# Altium footprint library Eis_Lib.PcbLib: 75 footprints (part 3 of 5)
Each footprint in its own frame and in the unit in brackets; x right, y up, seen from the top. Pads: shape width x height; smd on the part's side, far side on the other; paste and mask are expansions set on the pad; w line width, h text height; cw(c..) or ccw(c..) is an arc to the next point about the centre after c.
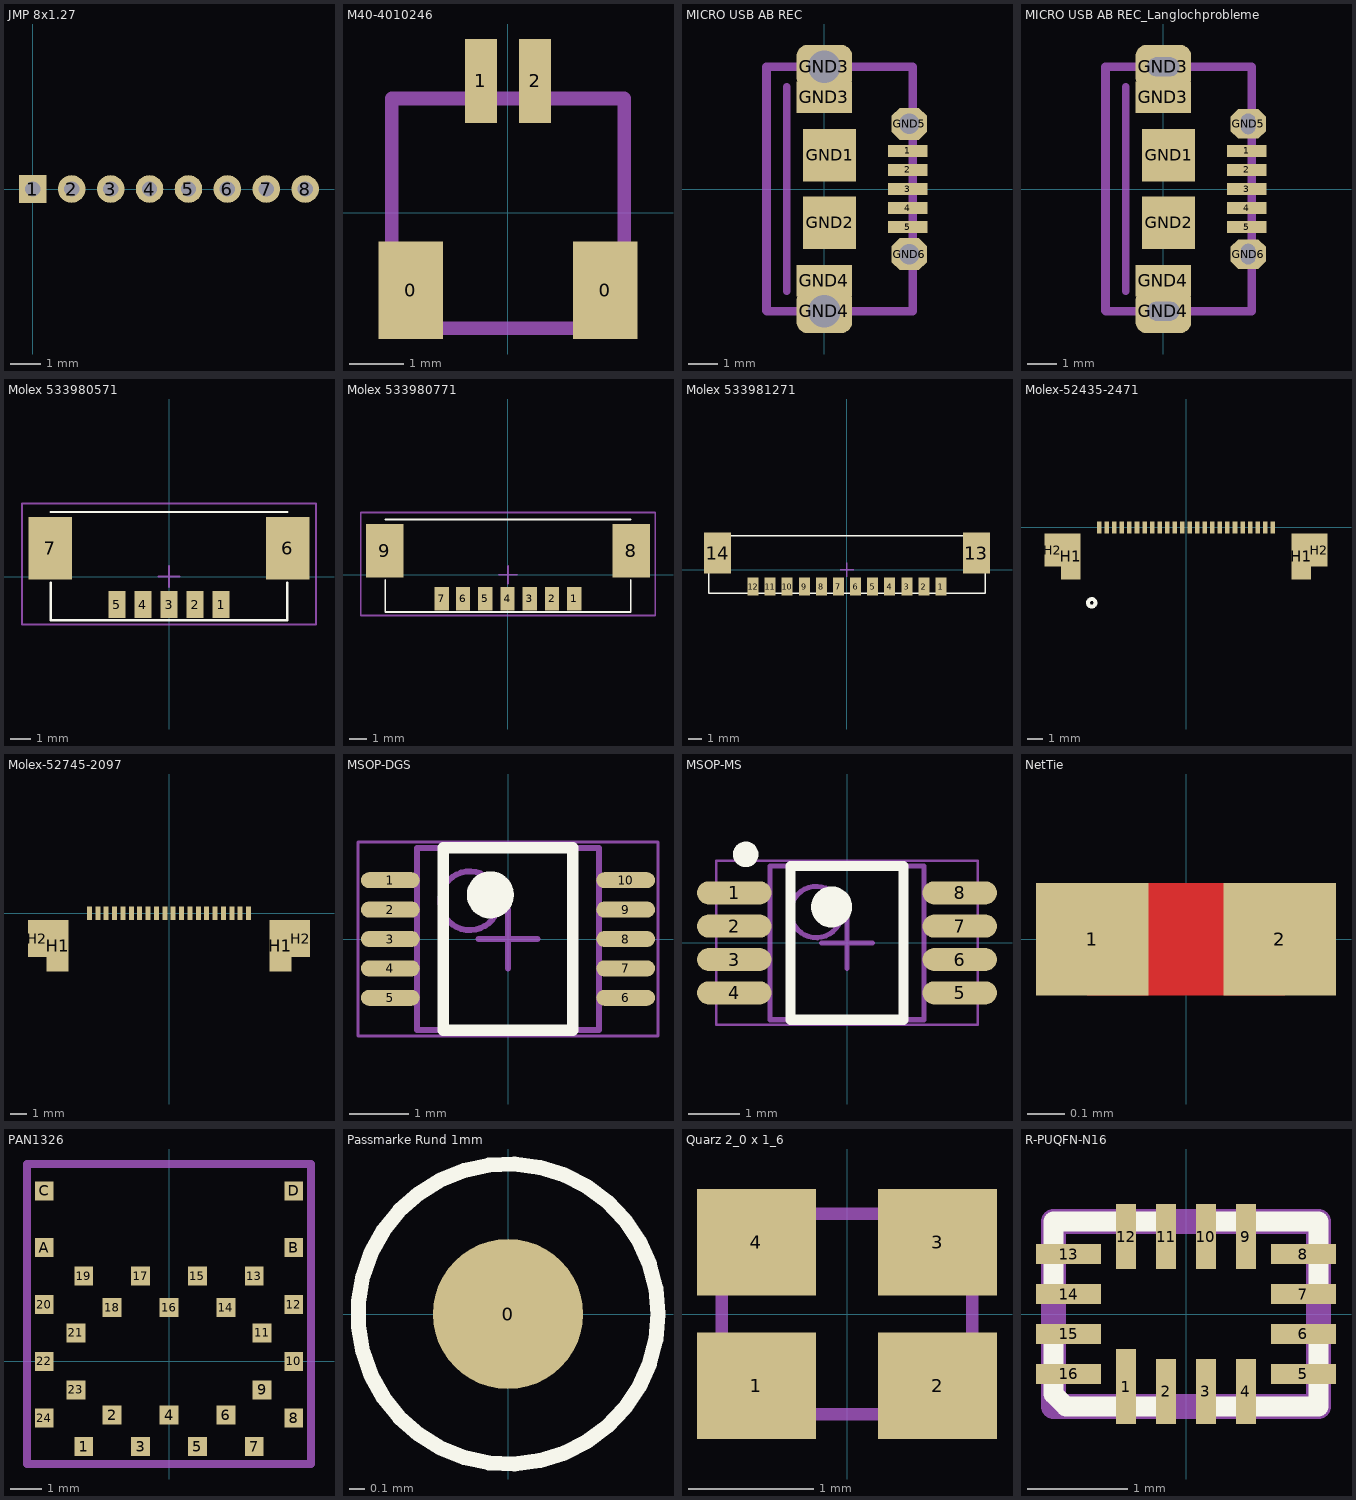
[diagram p2: the footprints below, top view; thin cyan lines are the x and y axes]

## JMP 8x1.27 [mm]
pads (8):
  rect 0.9x0.9 hole 0.5: 1(0,0)
  round 0.9 hole 0.5: 2(1.27,0) 3(2.54,0) 4(3.81,0) 5(5.08,0) 6(6.35,0) 7(7.62,0) 8(8.89,0)

## M40-4010246 [mm] "Harwin Stecker, 1mm Raster, 2polig"
height 2.9
pads (4):
  rect 1.2x1.8 smd paste-1: 0(-1.8,-1.438) 0(1.8,-1.438)
  rect 0.6x1.55 smd paste-1: 1(-0.5,2.438) 2(0.5,2.438)
Mechanical 13:
  lines w0.254: -2.15,-2.137 2.15,-2.137 2.15,2.113 -2.15,2.113 -2.15,-2.137
3D body: height 2.93, standoff 0.03, extent -2.15,-2.075 2.15,2.925

## MICRO USB AB REC [mm] "MOLEX-47589, MICRO USB AB, bottom mount"
pads (13):
  rect 1.35x0.4 smd: 1(2.855,1.3) 2(2.855,0.65) 3(2.855,0) 4(2.855,-0.65) 5(2.855,-1.3)
  rect 1.8x1.8 smd: GND1(0.18,1.15) GND2(0.18,-1.15)
  rect 1.9x1.075 smd: GND3(0,3.137) GND4(0,-3.137)
  rrect50% 1.9x1.5 hole 1.1: GND3(0,4.175) GND4(0,-4.175)
  oct 1.2x1.1 hole 0.7: GND5(2.9,2.225) GND6(2.9,-2.225)
Mechanical 13:
  lines w0.254: -1.98,-4.155 -1.96,-4.175 ; -1.28,-3.5 -1.28,3.5
  lines w0.3: -1.98,-4.155 -1.98,4.175 3.025,4.175 3.025,-4.175 -1.96,-4.175
3D body: height 2.76, standoff -0.58, extent -2.775,-4.3 3.019,4.35

## MICRO USB AB REC_Langlochprobleme [mm] "MOLEX-47589, MICRO USB AB, bottom mount"
pads (13):
  rect 1.35x0.4 smd: 1(2.855,1.3) 2(2.855,0.65) 3(2.855,0) 4(2.855,-0.65) 5(2.855,-1.3)
  rect 1.8x1.8 smd: GND1(0.18,1.15) GND2(0.18,-1.15)
  rect 1.9x1.075 smd: GND3(0,3.137) GND4(0,-3.137)
  rrect50% 1.9x1.5 hole 0.65 slot 1.1 at 0 deg: GND3(0,4.175) GND4(0,-4.175)
  oct 1.2x1 hole 0.5 slot 0.7 at 90 deg: GND5(2.9,2.225) GND6(2.9,-2.225)
Mechanical 13:
  lines w0.254: -1.98,-4.155 -1.96,-4.175 ; -1.28,-3.5 -1.28,3.5
  lines w0.3: -1.98,-4.155 -1.98,4.175 3.025,4.175 3.025,-4.175 -1.96,-4.175
3D body: height 2.76, standoff -0.58, extent -2.775,-4.3 3.019,4.35

## Molex 533980571 [mm] "MOLEX - 53398-0571 - STIFTLEISTE, SMT, 1.25MM, 5POL"
height 4.7
pads (7):
  rect 0.8x1.3 smd: 1(2.5,-1.35) 2(1.25,-1.35) 3(0,-1.35) 4(-1.25,-1.35) 5(-2.5,-1.35)
  rect 2.1x3 smd: 6(5.7,1.35) 7(-5.7,1.35)
Top Overlay:
  lines w0.1: -5.675,-0.3 -5.675,-2.1 5.675,-2.1 5.675,-0.3 ; -5.675,3.1 5.675,3.1
Mechanical 15:
  lines w0.1: -0.5,0 0.5,0 ; 0,-0.5 0,0.5 ; -7.05,-2.3 -7.05,3.5 7.05,3.5 7.05,-2.3 -7.05,-2.3
3D body: height 4.7, standoff 0, extent -5.7,-1.45 5.7,2.75

## Molex 533980771 [mm] "MOLEX - 53398-0771 - STIFTLEISTE, SMT, 1.25MM, 7POL"
height 4.7
pads (9):
  rect 0.8x1.3 smd: 1(3.725,-1.35) 2(2.475,-1.35) 3(1.225,-1.35) 4(-0.025,-1.35) 5(-1.275,-1.35) 6(-2.525,-1.35) 7(-3.725,-1.35)
  rect 2.1x3 smd: 8(6.925,1.35) 9(-6.925,1.35)
Top Overlay:
  lines w0.1: -6.9,-0.3 -6.9,-2.1 6.9,-2.1 6.9,-0.3 ; -6.9,3.1 6.9,3.1
Mechanical 15:
  lines w0.1: -0.5,0 0.5,0 ; 0,-0.5 0,0.5 ; -8.275,-2.3 8.275,-2.3 8.275,3.5 -8.275,3.5 -8.275,-2.3
3D body: height 4.7, standoff 0, extent -6.95,-1.75 6.95,2.45

## Molex 533981271 [mm] "Molex Pico 12Pol Blade SMD gerade 533980871"
pads (14):
  rect 0.8x1.3 smd: 1(6.875,-1.225) 2(5.625,-1.225) 3(4.375,-1.225) 4(3.125,-1.225) 5(1.875,-1.225) 6(0.625,-1.225) 7(-0.625,-1.225) 8(-1.875,-1.225) 9(-3.125,-1.225) 10(-4.375,-1.225) 11(-5.625,-1.225) 12(-6.875,-1.225)
  rect 2x3 smd: 13(9.475,1.225) 14(-9.475,1.225)
Top Overlay:
  lines w0.1: -10.1,-1.7 -10.1,2.5 10.1,2.5 10.1,-1.7 -10.1,-1.7
Mechanical 15:
  lines w0.1: -0.5,0 0.5,0 ; 0,-0.5 0,0.5
3D body: height 4.7, standoff 0, extent -10.075,-1.588 10.075,2.612

## Molex-52435-2471 [mm] "ZIF 24x0.5mm Kontakte oben"
height 2
pads (28):
  rect 0.3x0.8 smd: 1(-5.75,0) 2(-5.25,0) 3(-4.75,0) 4(-4.25,0) 5(-3.75,0) 6(-3.25,0) 7(-2.75,0) 8(-2.25,0) 9(-1.75,0) 10(-1.25,0) 11(-0.75,0) 12(-0.25,0) 13(0.25,0) 14(0.75,0) 15(1.25,0) 16(1.75,0) 17(2.25,0) 18(2.75,0) 19(3.25,0) 20(3.75,0) 21(4.25,0) 22(4.75,0) 23(5.25,0) 24(5.75,0)
  rect 1.3x3.05 smd: H1(-7.65,-1.925) H1(7.65,-1.925)
  rect 1.1x2.2 smd: H2(-8.85,-1.5) H2(8.85,-1.5)
Top Overlay:
  circle w0.254: c-6.25,-5 r0.25
3D body: height 2.05, standoff 0, extent -9.3,-6.4 9.3,0.2

## Molex-52745-2097 [mm]
pads (24):
  rect 0.3x0.8 smd: 1(-4.75,0) 2(-4.25,0) 3(-3.75,0) 4(-3.25,0) 5(-2.75,0) 6(-2.25,0) 7(-1.75,0) 8(-1.25,0) 9(-0.75,0) 10(-0.25,0) 11(0.25,0) 12(0.75,0) 13(1.25,0) 14(1.75,0) 15(2.25,0) 16(2.75,0) 17(3.25,0) 18(3.75,0) 19(4.25,0) 20(4.75,0)
  rect 1.3x3.05 smd: H1(-6.65,-1.925) H1(6.65,-1.925)
  rect 1.1x2.2 smd: H2(-7.85,-1.5) H2(7.85,-1.5)
3D body: height 2, standoff 0, extent -8.05,-6.2 8.05,0.2

## MSOP-DGS [mm] "DAC 124S085CIMM"
height 1.1
pads (10):
  oval 1x0.27 smd mask+0.025: 1(-2,1) 2(-2,0.5) 3(-2,0) 4(-2,-0.5) 5(-2,-1) 6(2,-1) 7(2,-0.5) 8(2,0) 9(2,0.5) 10(2,1)
Top Overlay:
  circle w0.4: c-0.3,0.75 r0.2
  lines w0.2: -1.1,-1.55 -1.1,1.55 1.1,1.55 1.1,-1.55 -1.1,-1.55
Mechanical 13:
  circle w0.1: c-0.65,0.65 r0.5
  lines w0.1: -1.55,-1.55 -1.55,1.55 1.55,1.55 1.55,-1.55 -1.55,-1.55
Mechanical 15:
  lines w0.05: -2.55,-1.65 -2.55,1.65 2.55,1.65 2.55,-1.65 -2.55,-1.65
  lines w0.1: -0.5,0 0.5,0 ; 0,-0.5 0,0.5
3D body: height 1.1, standoff 0.05, extent -1.55,-1.55 1.55,1.55

## MSOP-MS [mm] "MCP6542MS"
height 1.1
pads (8):
  oval 1.45x0.45 smd: 1(-2.2,0.975) 2(-2.2,0.325) 3(-2.2,-0.325) 4(-2.2,-0.975) 5(2.2,-0.975) 6(2.2,-0.325) 7(2.2,0.325) 8(2.2,0.975)
Top Overlay:
  circle w0.25: c-1.975,1.725 r0.125
  circle w0.4: c-0.3,0.7 r0.2
  lines w0.2: -1.1,-1.5 -1.1,1.5 1.1,1.5 1.1,-1.5 -1.1,-1.5
Mechanical 13:
  circle w0.1: c-0.6,0.6 r0.5
  lines w0.1: -1.5,-1.5 -1.5,1.5 1.5,1.5 1.5,-1.5 -1.5,-1.5
Mechanical 15:
  lines w0.05: -2.55,-1.6 -2.55,1.6 2.55,1.6 2.55,-1.6 -2.55,-1.6
  lines w0.1: -0.5,0 0.5,0 ; 0,-0.5 0,0.5
3D body: height 1.1, standoff 0, extent -1.5,-1.5 1.5,1.5

## NetTie [mm] "Kleiner Net-Tie um netze zu verbinden"
pads (2):
  rect 0.3x0.3 smd paste-0.2 mask-0.2: 1(-0.25,0) 2(0.25,0)
Top Layer:
  lines w0.3: -0.25,0 0.25,0

## PAN1326 [mm] "Footprint zu Bluetooth-Modulserie PAN13xx mit Antenne"
height 1.8
pads (28):
  rect 0.6x0.6 smd: 1(-2.7,-2.7) 2(-1.8,-1.7) 3(-0.9,-2.7) 4(0,-1.7) 5(0.9,-2.7) 6(1.8,-1.7) 7(2.7,-2.7) 8(3.95,-1.8) 9(2.95,-0.9) 10(3.95,0) 11(2.95,0.9) 12(3.95,1.8) 13(2.7,2.7) 14(1.8,1.7) 15(0.9,2.7) 16(0,1.7) 17(-0.9,2.7) 18(-1.8,1.7) 19(-2.7,2.7) 20(-3.95,1.8) 21(-2.95,0.9) 22(-3.95,0) 23(-2.95,-0.9) 24(-3.95,-1.8) A(-3.95,3.6) B(3.95,3.6) C(-3.95,5.4) D(3.95,5.4)
Mechanical 13:
  lines w0.254: -4.5,-3.25 4.5,-3.25 4.5,6.25 -4.5,6.25 -4.5,-3.25
3D body: height 1.71, standoff -0.02, extent -4.556,-3.202 4.444,6.298

## Passmarke Rund 1mm [mm]
pads (1):
  round 1 smd paste+0 mask+0.5: 0(0,0)
Top Overlay:
  circle w0.1: c0,0 r1

## Quarz 2_0 x 1_6 [mm] "Q22FA1280xxxx00"
height 0.5
pads (4):
  rect 0.95x0.85 smd: 1(-0.725,-0.575) 2(0.725,-0.575) 3(0.725,0.575) 4(-0.725,0.575)
Mechanical 3:
  lines w0.1: -1,-0.8 -1,0.8 1,0.8 1,-0.8 -1,-0.8
3D body: height 0.5, standoff 0, extent -1,-0.8 1,0.8

## R-PUQFN-N16 [mm]
pads (16):
  rect 0.2x0.75 smd mask+0: 1(-0.6,-0.725)
  rect 0.2x0.65 smd mask+0: 2(-0.2,-0.775) 3(0.2,-0.775) 4(0.6,-0.775) 9(0.6,0.775) 10(0.2,0.775) 11(-0.2,0.775) 12(-0.6,0.775)
  rect 0.65x0.2 smd mask+0: 5(1.175,-0.6) 6(1.175,-0.2) 7(1.175,0.2) 8(1.175,0.6) 13(-1.175,0.6) 14(-1.175,0.2) 15(-1.175,-0.2) 16(-1.175,-0.6)
Top Overlay:
  lines w0.2: -1.325,-0.8 -1.325,-0.2 ; -1.325,-0.8 -1.2,-0.925 -0.2,-0.925 ; -1.325,0.225 -1.325,0.925 -0.2,0.925 ; 0.2,-0.925 1.325,-0.925 1.325,-0.2 ; 0.2,0.925 1.325,0.925 1.325,0.2
Mechanical 13:
  lines w0.254: -1.325,-0.925 -1.325,0.925 1.325,0.925 1.325,-0.925 -1.325,-0.925
3D body: height 0.55, standoff 0.05, extent -1.452,-1.052 1.452,1.052